# Altium footprint library My Library.PcbLib: 872 footprints (part 2 of 55)
Each footprint in its own frame and in the unit in brackets; x right, y up, seen from the top. Pads: shape width x height; smd on the part's side, far side on the other; paste and mask are expansions set on the pad; w line width, h text height; cw(c..) or ccw(c..) is an arc to the next point about the centre after c.
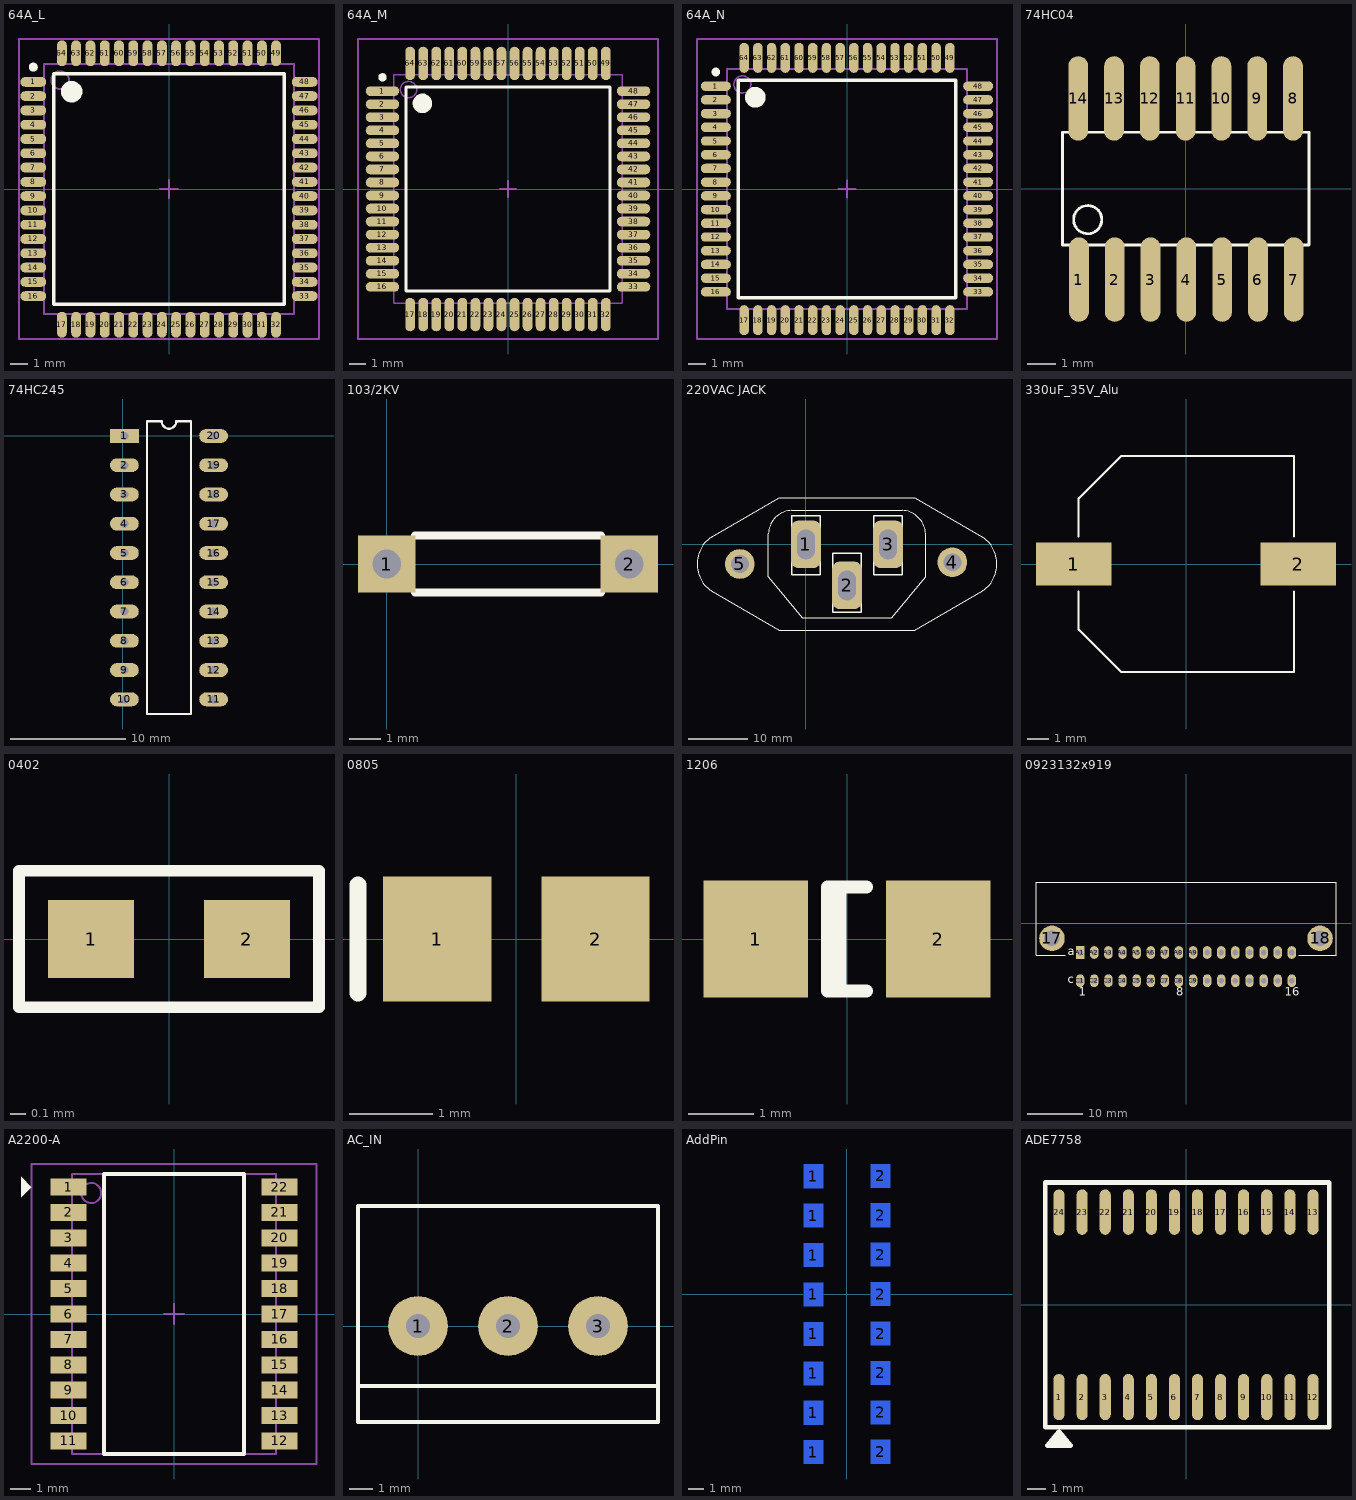
[diagram p1: the footprints below, top view; thin cyan lines are the x and y axes]

## 64A_L [mm] "Thin QFP, 64-Leads, Body 14x14mm, Pitch 0.8mm, IPC High Density"
height 1.2
pads (64):
  oval 1.45x0.55 smd: 1(-7.6,6) 2(-7.6,5.2) 3(-7.6,4.4) 4(-7.6,3.6) 5(-7.6,2.8) 6(-7.6,2) 7(-7.6,1.2) 8(-7.6,0.4) 9(-7.6,-0.4) 10(-7.6,-1.2) 11(-7.6,-2) 12(-7.6,-2.8) 13(-7.6,-3.6) 14(-7.6,-4.4) 15(-7.6,-5.2) 16(-7.6,-6) 33(7.6,-6) 34(7.6,-5.2) 35(7.6,-4.4) 36(7.6,-3.6) 37(7.6,-2.8) 38(7.6,-2) 39(7.6,-1.2) 40(7.6,-0.4) 41(7.6,0.4) 42(7.6,1.2) 43(7.6,2) 44(7.6,2.8) 45(7.6,3.6) 46(7.6,4.4) 47(7.6,5.2) 48(7.6,6)
  oval 0.55x1.45 smd: 17(-6,-7.6) 18(-5.2,-7.6) 19(-4.4,-7.6) 20(-3.6,-7.6) 21(-2.8,-7.6) 22(-2,-7.6) 23(-1.2,-7.6) 24(-0.4,-7.6) 25(0.4,-7.6) 26(1.2,-7.6) 27(2,-7.6) 28(2.8,-7.6) 29(3.6,-7.6) 30(4.4,-7.6) 31(5.2,-7.6) 32(6,-7.6) 49(6,7.6) 50(5.2,7.6) 51(4.4,7.6) 52(3.6,7.6) 53(2.8,7.6) 54(2,7.6) 55(1.2,7.6) 56(0.4,7.6) 57(-0.4,7.6) 58(-1.2,7.6) 59(-2,7.6) 60(-2.8,7.6) 61(-3.6,7.6) 62(-4.4,7.6) 63(-5.2,7.6) 64(-6,7.6)
Top Overlay:
  circle w0.6: c-5.45,5.45 r0.3
  circle w0.25: c-7.6,6.825 r0.125
  lines w0.2: -6.45,-6.45 6.45,-6.45 6.45,6.45 -6.45,6.45 -6.45,-6.45
Mechanical 13:
  circle w0.1: c-6.1,6.1 r0.5
  lines w0.1: -7,-7 7,-7 7,7 -7,7 -7,-7
Mechanical 15:
  lines w0.1: -0.5,0 0.5,0 ; 0,-0.5 0,0.5 ; -8.4,-8.4 8.4,-8.4 8.4,8.4 -8.4,8.4 -8.4,-8.4
3D body: height 1.2, standoff 0, extent -7,-7 7,7

## 64A_M [mm] "Thin QFP, 64-Leads, Body 14x14mm, Pitch 0.8mm, IPC Low Density"
height 1.2
pads (64):
  oval 2.05x0.6 smd: 1(-7.7,6) 2(-7.7,5.2) 3(-7.7,4.4) 4(-7.7,3.6) 5(-7.7,2.8) 6(-7.7,2) 7(-7.7,1.2) 8(-7.7,0.4) 9(-7.7,-0.4) 10(-7.7,-1.2) 11(-7.7,-2) 12(-7.7,-2.8) 13(-7.7,-3.6) 14(-7.7,-4.4) 15(-7.7,-5.2) 16(-7.7,-6) 33(7.7,-6) 34(7.7,-5.2) 35(7.7,-4.4) 36(7.7,-3.6) 37(7.7,-2.8) 38(7.7,-2) 39(7.7,-1.2) 40(7.7,-0.4) 41(7.7,0.4) 42(7.7,1.2) 43(7.7,2) 44(7.7,2.8) 45(7.7,3.6) 46(7.7,4.4) 47(7.7,5.2) 48(7.7,6)
  oval 0.6x2.05 smd: 17(-6,-7.7) 18(-5.2,-7.7) 19(-4.4,-7.7) 20(-3.6,-7.7) 21(-2.8,-7.7) 22(-2,-7.7) 23(-1.2,-7.7) 24(-0.4,-7.7) 25(0.4,-7.7) 26(1.2,-7.7) 27(2,-7.7) 28(2.8,-7.7) 29(3.6,-7.7) 30(4.4,-7.7) 31(5.2,-7.7) 32(6,-7.7) 49(6,7.7) 50(5.2,7.7) 51(4.4,7.7) 52(3.6,7.7) 53(2.8,7.7) 54(2,7.7) 55(1.2,7.7) 56(0.4,7.7) 57(-0.4,7.7) 58(-1.2,7.7) 59(-2,7.7) 60(-2.8,7.7) 61(-3.6,7.7) 62(-4.4,7.7) 63(-5.2,7.7) 64(-6,7.7)
Top Overlay:
  circle w0.6: c-5.25,5.25 r0.3
  circle w0.25: c-7.7,6.85 r0.125
  lines w0.2: -6.25,-6.25 6.25,-6.25 6.25,6.25 -6.25,6.25 -6.25,-6.25
Mechanical 13:
  circle w0.1: c-6.1,6.1 r0.5
  lines w0.1: -7,-7 7,-7 7,7 -7,7 -7,-7
Mechanical 15:
  lines w0.1: -0.5,0 0.5,0 ; 0,-0.5 0,0.5 ; -9.2,-9.2 9.2,-9.2 9.2,9.2 -9.2,9.2 -9.2,-9.2
3D body: height 1.2, standoff 0, extent -7,-7 7,7

## 64A_N [mm] "Thin QFP, 64-Leads, Body 14x14mm, Pitch 0.8mm, IPC Medium Density"
height 1.2
pads (64):
  oval 1.75x0.55 smd: 1(-7.65,6) 2(-7.65,5.2) 3(-7.65,4.4) 4(-7.65,3.6) 5(-7.65,2.8) 6(-7.65,2) 7(-7.65,1.2) 8(-7.65,0.4) 9(-7.65,-0.4) 10(-7.65,-1.2) 11(-7.65,-2) 12(-7.65,-2.8) 13(-7.65,-3.6) 14(-7.65,-4.4) 15(-7.65,-5.2) 16(-7.65,-6) 33(7.65,-6) 34(7.65,-5.2) 35(7.65,-4.4) 36(7.65,-3.6) 37(7.65,-2.8) 38(7.65,-2) 39(7.65,-1.2) 40(7.65,-0.4) 41(7.65,0.4) 42(7.65,1.2) 43(7.65,2) 44(7.65,2.8) 45(7.65,3.6) 46(7.65,4.4) 47(7.65,5.2) 48(7.65,6)
  oval 0.55x1.75 smd: 17(-6,-7.65) 18(-5.2,-7.65) 19(-4.4,-7.65) 20(-3.6,-7.65) 21(-2.8,-7.65) 22(-2,-7.65) 23(-1.2,-7.65) 24(-0.4,-7.65) 25(0.4,-7.65) 26(1.2,-7.65) 27(2,-7.65) 28(2.8,-7.65) 29(3.6,-7.65) 30(4.4,-7.65) 31(5.2,-7.65) 32(6,-7.65) 49(6,7.65) 50(5.2,7.65) 51(4.4,7.65) 52(3.6,7.65) 53(2.8,7.65) 54(2,7.65) 55(1.2,7.65) 56(0.4,7.65) 57(-0.4,7.65) 58(-1.2,7.65) 59(-2,7.65) 60(-2.8,7.65) 61(-3.6,7.65) 62(-4.4,7.65) 63(-5.2,7.65) 64(-6,7.65)
Top Overlay:
  circle w0.25: c-7.65,6.825 r0.125
  circle w0.6: c-5.35,5.35 r0.3
  lines w0.2: -6.35,-6.35 -6.35,6.35 6.35,6.35 6.35,-6.35 -6.35,-6.35
Mechanical 13:
  circle w0.1: c-6.1,6.1 r0.5
  lines w0.1: -7,-7 -7,7 7,7 7,-7 -7,-7
Mechanical 15:
  lines w0.1: -0.5,0 0.5,0 ; 0,-0.5 0,0.5 ; -8.75,-8.75 -8.75,8.75 8.75,8.75 8.75,-8.75 -8.75,-8.75
3D body: height 1.2, standoff 0, extent -7,-7 7,7

## 74HC04 [mm] "SOIC, 14-Leads, Body 8.7x3.9mm, Pitch 1.27mm, IPC Low Density"
height 1.75
pads (14):
  oval 0.7x3 smd: 1(-3.785,-3.226) 2(-2.515,-3.226) 3(-1.245,-3.226) 4(0.025,-3.226) 5(1.295,-3.226) 6(2.565,-3.226) 7(3.835,-3.226) 8(3.81,3.2) 9(2.54,3.2) 10(1.27,3.2) 11(0,3.2) 12(-1.27,3.2) 13(-2.54,3.2) 14(-3.81,3.2)
Top Layer:
  lines w0.254: 0,-3.2 0.025,-3.226
Top Overlay:
  circle w0.1: c-3.475,-1.1 r0.5
  lines w0.1: -4.375,-2 -4.375,2 4.375,2 4.375,-2 -4.375,-2
3D body "User Library-SOP14-p127-780.step": height 1.1, standoff 0, extent -5.08,-3.642 5.12,3.658

## 74HC245 [mm] "74HC245"
pads (20):
  rect 2.5x1.2 hole 0.7: 1(0.127,0)
  oval 2.5x1.2 hole 0.7: 2(0.127,-2.54) 3(0.127,-5.08) 4(0.127,-7.62) 5(0.127,-10.16) 6(0.127,-12.7) 7(0.127,-15.24) 8(0.127,-17.78) 9(0.127,-20.32) 10(0.127,-22.86) 11(7.874,-22.86) 12(7.874,-20.32) 13(7.874,-17.78) 14(7.874,-15.24) 15(7.874,-12.7) 16(7.874,-10.16) 17(7.874,-7.62) 18(7.874,-5.08) 19(7.874,-2.54) 20(7.874,0)
Top Overlay:
  lines w0.2: 2.085,-24.13 2.085,1.27 3.365,1.27 ccw(c4,1.27) 4.635,1.27 5.915,1.27 5.915,-24.13 2.085,-24.13
3D body "User Library-DIP20-300-metric.step": height 4.5, standoff -3.5, extent 0.184,-24.257 7.944,1.343

## 103/2KV [mm]
pads (2):
  rect 1.8x1.8 hole 0.9: 1(0,0) 2(7.62,0)
Top Overlay:
  lines w0.254: 0.889,-0.889 6.731,-0.889 ; 0.889,0.889 6.731,0.889
3D body "User Library-Panasonic ECK-A3D102KBP.step": height 9.03, standoff -4.16, extent -0.19,-1.198 7.811,1.195

## 220VAC JACK [mm]
pads (5):
  rrect50% 5x8 hole 3 slot 5 at 90 deg: 1(0,0) 2(6.903,-6.903) 3(13.807,0)
  round 5 hole 3: 4(24.612,-3.001) 5(-11.105,-3.302)
Top Overlay:
  lines w0.2: -15.923,-7.804 -4.486,-14.407 ; -15.923,1.201 -4.486,7.804 ; -15.908,-7.804 cw(c-12.887,-3.302) -15.908,1.201 ; -4.502,-14.407 18.309,-14.407 ; -4.502,7.804 18.309,7.804 ; 18.293,-14.406 29.73,-7.803 ; 18.293,7.804 29.73,1.201 ; 29.714,-7.804 ccw(c26.694,-3.302) 29.714,1.201 ; -6.303,-5.403 -0.6,-12.306 14.407,-12.306 20.11,-5.403 20.11,1.801 ccw(c15.997,1.59) 16.208,5.703 -2.401,5.703 ccw(c-2.251,1.651) -6.303,1.801 -6.303,-5.403
  lines w0.254: -2.401,-5.102 -2.401,4.802 2.401,4.802 2.401,-5.102 -2.401,-5.102 ; 4.502,-11.405 4.502,-1.501 9.304,-1.501 9.304,-11.405 4.502,-11.405 ; 11.405,-5.102 11.405,4.802 16.208,4.802 16.208,-5.102 11.405,-5.102

## 330uF_35V_Alu [mm] "Tu 330uF/35V- 220uF/50V"
pads (2):
  rect 3.5x2 smd: 1(-5.2,0) 2(5.2,0)
Top Overlay:
  lines w0.102: -4.978,-1.27 -4.978,-3.023 -2.997,-5.004 ; -4.978,1.27 -4.978,3.023 -2.997,5.004 ; -3,-5 5,-5 5,-1.27 ; -3,5 5,5 5,1.27
3D body: height 10, standoff 2.6, extent -4.999,-4.999 4.999,4.999
3D body: height 2.1, standoff 0.2, extent -4.999,-4.999 4.999,4.999
3D body: height 2.6, standoff 2.1, extent -4.799,-4.799 4.799,4.799
3D body: height 10.01, standoff 10, extent 2.515,-4.318 5.004,4.318
3D body: height 0.2, standoff 0, extent -6.248,-0.508 -2.54,0.508
3D body: height 0.2, standoff 0, extent 2.54,-0.508 6.248,0.508
3D body: height 2.1, standoff 0.6, extent 1.27,-5.004 5.004,-1.016
3D body: height 2.1, standoff 0.6, extent 1.016,1.27 5.004,5.004
3D body: height 1.1, standoff 0.6, extent -4.978,-5.004 -1.245,-1.041
3D body: height 1.1, standoff 0.6, extent -4.978,1.27 -1.016,5.004
3D body: height 0.6, standoff 0.1, extent -4.978,-5.004 5.004,5.004

## 0402 [mil]
pads (2):
  rect 22x20 smd: 1(-20,0) 2(20,0)
Top Overlay:
  lines w3: -38.5,-17.5 -38.5,17.5 38.5,17.5 38.5,-17.5 -38.5,-17.5

## 0805 [mm] "Chip Capacitor; Body 2.0 x 1.2 mm (LxW typ)"
height 1.3
pads (2):
  rect 1.3x1.5 smd: 1(-0.95,0) 2(0.95,0)
Top Overlay:
  lines w0.2: -1.9,-0.65 -1.9,0.65

## 1206 [mm] "Chip Capacitor; Body 3.2 x 1.6 mm (LxW typ)"
height 1.5
pads (2):
  rect 1.6x1.8 smd: 1(-1.4,0) 2(1.4,0)
Top Overlay:
  lines w0.2: -0.11,-0.8 -0.11,0.8 ; 0.3,-0.8 -0.3,-0.8 -0.3,0.8 0.3,0.8

## 0923132x919 [mm] "Connector; DIN 41612, Type 2C, Thru-Hole; Rows a+c, 32 Position; Right Angle"
height 11.1
pads (34):
  round 4.6 hole 2.8: 17(-24.13,-2.76) 18(24.13,-2.76)
  rect 1.524x2.286 hole 1: A1(-19.05,-5.3)
  oval 1.524x2.286 hole 1: A2(-16.51,-5.3) A3(-13.97,-5.3) A4(-11.43,-5.3) A5(-8.89,-5.3) A6(-6.35,-5.3) A7(-3.81,-5.3) A8(-1.27,-5.3) A9(1.27,-5.3) A10(3.81,-5.3) A11(6.35,-5.3) A12(8.89,-5.3) A13(11.43,-5.3) A14(13.97,-5.3) A15(16.51,-5.3) A16(19.05,-5.3) C1(-19.05,-10.38) C2(-16.51,-10.38) C3(-13.97,-10.38) C4(-11.43,-10.38) C5(-8.89,-10.38) C6(-6.35,-10.38) C7(-3.81,-10.38) C8(-1.27,-10.38) C9(1.27,-10.38) C10(3.81,-10.38) C11(6.35,-10.38) C12(8.89,-10.38) C13(11.43,-10.38) C14(13.97,-10.38) C15(16.51,-10.38) C16(19.05,-10.38)
Top Overlay:
  lines w0.2: -21.75,-5.8 -27,-5.8 -27,7.34 27,7.34 27,-5.8 20.275,-5.8
  text "16" at 17.8,-13.08 h1.5
  text "8" at -1.77,-13.08 h1.5
  text "c" at -21.26,-10.88 h1.5
  text "a" at -21.26,-5.8 h1.5
  text "1" at -19.3,-13.08 h1.5
Mechanical 1:
  lines w0.1: -27,0 27,0
  text "PCB Edge" at -26.15,0.5 h0.6

## A2200-A [mm] "SOJ, 22-Leads, Body 14,0x12,0mm (max), Pitch 1,27mm, IPC Low Density"
height 0.8
pads (22):
  rect 1.8x0.85 smd: 1(-5.275,6.35) 2(-5.275,5.08) 3(-5.275,3.81) 4(-5.275,2.54) 5(-5.275,1.27) 6(-5.275,0) 7(-5.275,-1.27) 8(-5.275,-2.54) 9(-5.275,-3.81) 10(-5.275,-5.08) 11(-5.275,-6.35) 12(5.275,-6.35) 13(5.275,-5.08) 14(5.275,-3.81) 15(5.275,-2.54) 16(5.275,-1.27) 17(5.275,0) 18(5.275,1.27) 19(5.275,2.54) 20(5.275,3.81) 21(5.275,5.08) 22(5.275,6.35)
Top Overlay:
  region: -7.645,6.858 -7.137,6.35 -7.645,5.842
  lines w0.2: -3.5,-7 -3.5,7 3.5,7 3.5,-7 -3.5,-7
Mechanical 13:
  circle w0.1: c-4.15,6.05 r0.5
  lines w0.1: -5.1,-7 -5.1,7 5.1,7 5.1,-7 -5.1,-7
Mechanical 15:
  lines w0.1: -0.5,0 0.5,0 ; 0,-0.5 0,0.5 ; -7.125,-7.5 -7.125,7.5 7.125,7.5 7.125,-7.5 -7.125,-7.5
3D body: height 2, standoff 0.2, extent -4.394,-6.375 4.496,6.35
3D body: height 0.8, standoff 0.1, extent -5.1,-7 5.1,7

## AC_IN [mil] "AC_Input"
height 3
pads (3):
  round 100 hole 40 square: 1(0,0) 2(150,0) 3(300,0)
Top Overlay:
  lines w7: -100,-100 400,-100 ; -100,-160 400,-160 400,200 -100,200 -100,-160

## AddPin [mil] "Add"
pads (16):
  rect 50x60 smd far side: 1(-84,-400) 1(-84,-300) 1(-84,-200) 1(-84,-100) 1(-84,0) 1(-84,100) 1(-84,200) 1(-84,300) 2(86,-399) 2(86,-299) 2(86,-199) 2(86,-99) 2(86,1) 2(86,101) 2(86,201) 2(86,301)

## ADE7758 [mil]
pads (24):
  oval 24x100 smd: 1(-275,-200) 2(-225,-200) 3(-175,-200) 4(-125,-200) 5(-75,-200) 6(-25,-200) 7(25,-200) 8(75,-200) 9(125,-200) 10(175,-200) 11(225,-200) 12(275,-200) 24(-275,200)
  oval 24x98.43 smd: 13(275,200.79) 14(225,200.79) 15(175,200.79) 16(125,200.79) 17(75,200.79) 18(25,200.79) 19(-25,200.79) 20(-75,200.79) 21(-125,200.79) 22(-175,200.79) 23(-225,200.79)
Top Overlay:
  region: -275,-275 -300,-305 -250,-305
  lines w10: -305,-265 310,-265 310,265 -305,265 -305,-265 ; -300,-305 -275,-275 -250,-305 -300,-305
3D body: height 53.15, standoff 49.21, extent 265,137.01 285,187.01
3D body: height 53.15, standoff 0, extent 265,187.01 285,192.01
3D body: height 3.94, standoff 0, extent 265,192.01 285,222.01
3D body: height 3.94, standoff 0, extent 215,192.01 235,222.01
3D body: height 53.15, standoff 0, extent 215,187.01 235,192.01
3D body: height 53.15, standoff 49.21, extent 215,137.01 235,187.01
3D body: height 3.94, standoff 0, extent 165,192.01 185,222.01
3D body: height 53.15, standoff 0, extent 165,187.01 185,192.01
3D body: height 53.15, standoff 49.21, extent 165,137.01 185,187.01
3D body: height 3.94, standoff 0, extent 115,192.01 135,222.01
3D body: height 53.15, standoff 0, extent 115,187.01 135,192.01
3D body: height 53.15, standoff 49.21, extent 115,137.01 135,187.01
3D body: height 53.15, standoff 49.21, extent -85,137.01 -65,187.01
3D body: height 53.15, standoff 0, extent -85,187.01 -65,192.01
3D body: height 3.94, standoff 0, extent -85,192.01 -65,222.01
3D body: height 53.15, standoff 49.21, extent -35,137.01 -15,187.01
3D body: height 53.15, standoff 0, extent -35,187.01 -15,192.01
3D body: height 3.94, standoff 0, extent -35,192.01 -15,222.01
3D body: height 53.15, standoff 49.21, extent 15,137.01 35,187.01
3D body: height 53.15, standoff 0, extent 15,187.01 35,192.01
3D body: height 3.94, standoff 0, extent 15,192.01 35,222.01
3D body: height 3.94, standoff 0, extent 65,192.01 85,222.01
3D body: height 53.15, standoff 0, extent 65,187.01 85,192.01
3D body: height 53.15, standoff 49.21, extent 65,137.01 85,187.01
3D body: height 53.15, standoff 49.21, extent -285,137.01 -265,187.01
3D body: height 53.15, standoff 0, extent -285,187.01 -265,192.01
3D body: height 3.94, standoff 0, extent -285,192.01 -265,222.01
3D body: height 53.15, standoff 49.21, extent -235,137.01 -215,187.01
3D body: height 53.15, standoff 0, extent -235,187.01 -215,192.01
3D body: height 3.94, standoff 0, extent -235,192.01 -215,222.01
3D body: height 53.15, standoff 49.21, extent -185,137.01 -165,187.01
3D body: height 53.15, standoff 0, extent -185,187.01 -165,192.01
3D body: height 3.94, standoff 0, extent -185,192.01 -165,222.01
3D body: height 3.94, standoff 0, extent -135,192.01 -115,222.01
3D body: height 53.15, standoff 0, extent -135,187.01 -115,192.01
3D body: height 53.15, standoff 49.21, extent -135,137.01 -115,187.01
3D body: height 53.15, standoff 49.21, extent 115,-186.22 135,-136.22
3D body: height 53.15, standoff 0, extent 115,-191.22 135,-186.22
3D body: height 3.94, standoff 0, extent 115,-221.22 135,-191.22
3D body: height 3.94, standoff 0, extent 165,-221.22 185,-191.22
3D body: height 53.15, standoff 0, extent 165,-191.22 185,-186.22
3D body: height 53.15, standoff 49.21, extent 165,-186.22 185,-136.22
3D body: height 3.94, standoff 0, extent 215,-221.22 235,-191.22
3D body: height 53.15, standoff 0, extent 215,-191.22 235,-186.22
3D body: height 53.15, standoff 49.21, extent 215,-186.22 235,-136.22
3D body: height 3.94, standoff 0, extent 265,-221.22 285,-191.22
3D body: height 53.15, standoff 0, extent 265,-191.22 285,-186.22
3D body: height 53.15, standoff 49.21, extent 265,-186.22 285,-136.22
3D body: height 53.15, standoff 49.21, extent -85,-186.22 -65,-136.22
3D body: height 53.15, standoff 0, extent -85,-191.22 -65,-186.22
3D body: height 3.94, standoff 0, extent -85,-221.22 -65,-191.22
3D body: height 3.94, standoff 0, extent -35,-221.22 -15,-191.22
3D body: height 53.15, standoff 0, extent -35,-191.22 -15,-186.22
3D body: height 53.15, standoff 49.21, extent -35,-186.22 -15,-136.22
3D body: height 3.94, standoff 0, extent 15,-221.22 35,-191.22
3D body: height 53.15, standoff 0, extent 15,-191.22 35,-186.22
3D body: height 53.15, standoff 49.21, extent 15,-186.22 35,-136.22
3D body: height 3.94, standoff 0, extent 65,-221.22 85,-191.22
3D body: height 53.15, standoff 0, extent 65,-191.22 85,-186.22
3D body: height 53.15, standoff 49.21, extent 65,-186.22 85,-136.22
3D body: height 53.15, standoff 49.21, extent -135,-186.22 -115,-136.22
3D body: height 53.15, standoff 0, extent -135,-191.22 -115,-186.22
3D body: height 3.94, standoff 0, extent -135,-221.22 -115,-191.22
3D body: height 53.15, standoff 49.21, extent -185,-186.22 -165,-136.22
3D body: height 53.15, standoff 0, extent -185,-191.22 -165,-186.22
3D body: height 3.94, standoff 0, extent -185,-221.22 -165,-191.22
3D body: height 53.15, standoff 49.21, extent -235,-186.22 -215,-136.22
3D body: height 53.15, standoff 0, extent -235,-191.22 -215,-186.22
3D body: height 3.94, standoff 0, extent -235,-221.22 -215,-191.22
3D body: height 3.94, standoff 0, extent -285,-221.22 -265,-191.22
3D body: height 53.15, standoff 0, extent -285,-191.22 -265,-186.22
3D body: height 53.15, standoff 49.21, extent -285,-186.22 -265,-136.22
3D body: height 104.33, standoff 0, extent -299.98,-150 299.98,150